# Altium footprint library Custom_Library.PcbLib: 221 footprints (part 14 of 14)
Each footprint in its own frame and in the unit in brackets; x right, y up, seen from the top. Pads: shape width x height; smd on the part's side, far side on the other; paste and mask are expansions set on the pad; w line width, h text height; cw(c..) or ccw(c..) is an arc to the next point about the centre after c.
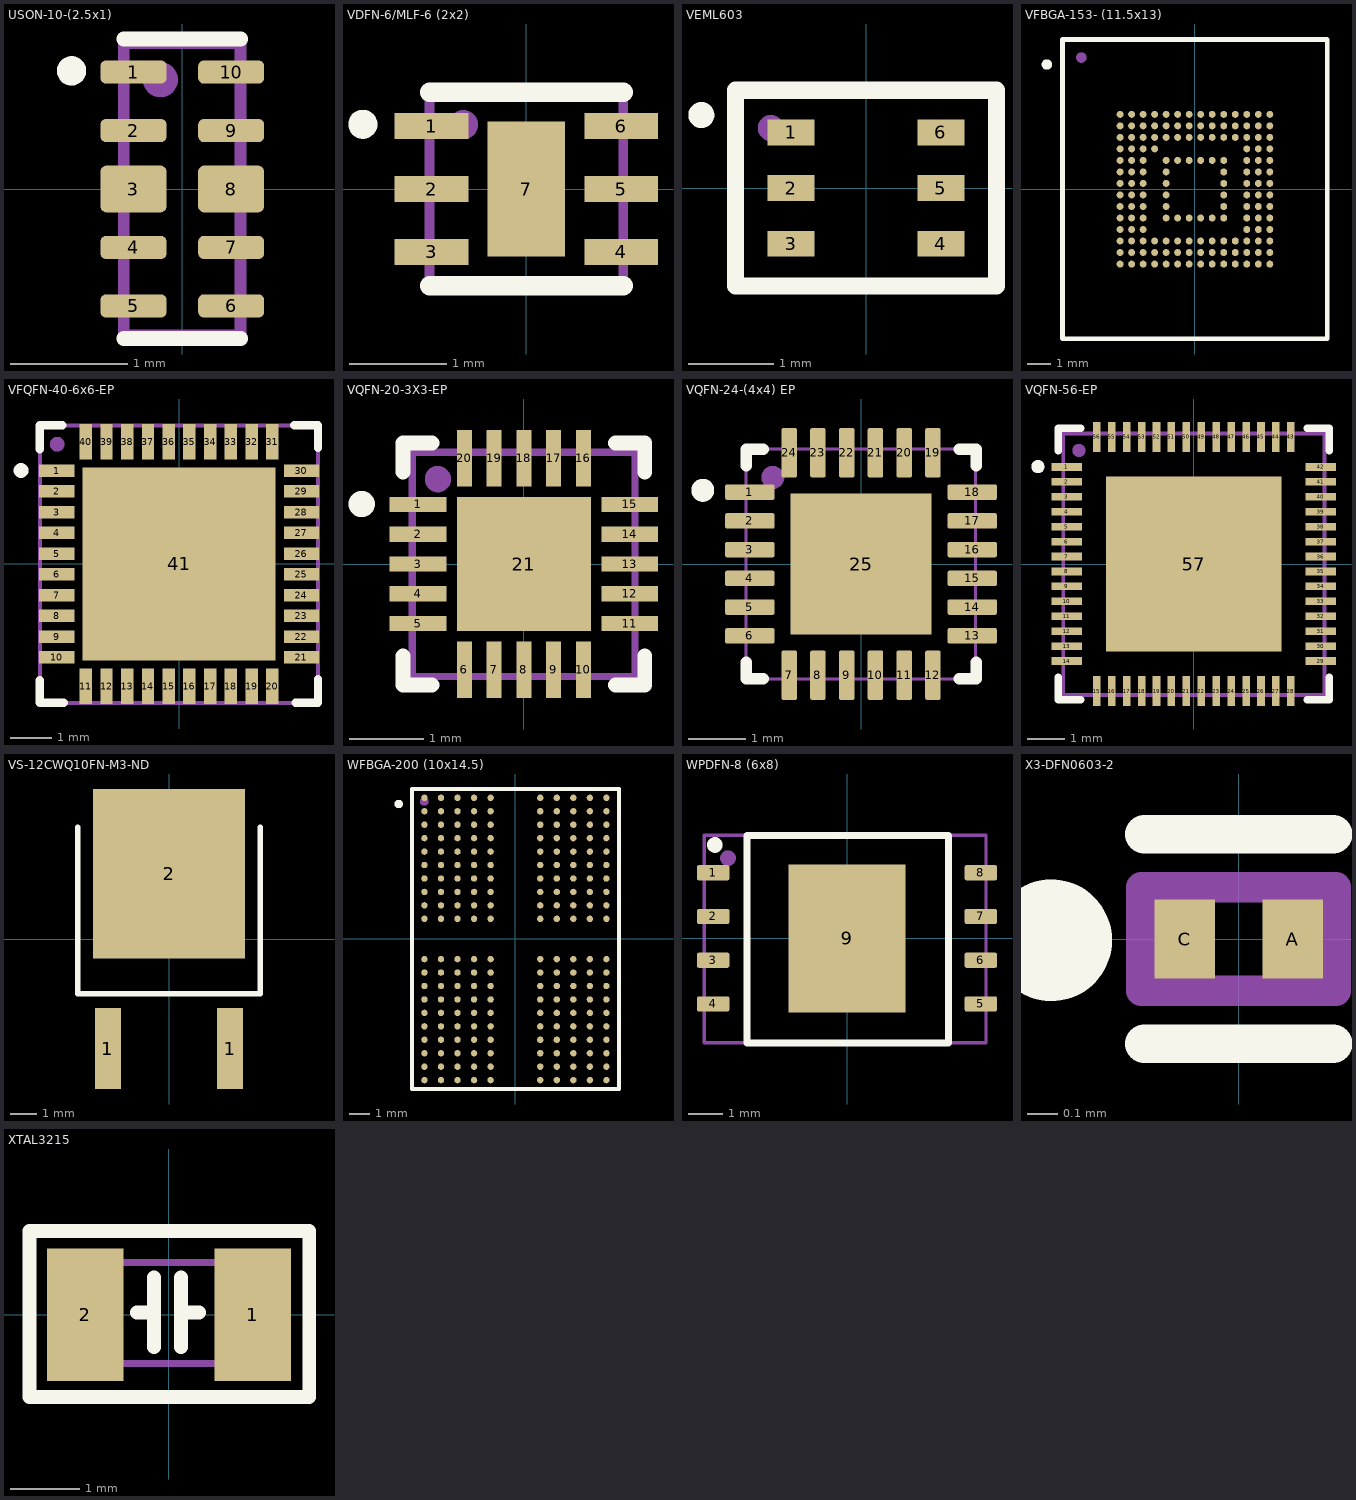
[diagram p13: the footprints below, top view; thin cyan lines are the x and y axes]

## USON-10-(2.5x1) [mm]
pads (10):
  rrect50% 0.565x0.2 smd mask+0: 1(-0.417,1) 2(-0.417,0.5) 4(-0.417,-0.5) 5(-0.417,-1) 6(0.417,-1) 7(0.417,-0.5) 9(0.417,0.5) 10(0.417,1)
  rrect25% 0.565x0.4 smd paste-1 mask+0: 3(-0.417,0) 8(0.417,0)
Top Overlay:
  circle w0.15: c-0.948,1.01 r0.05
  lines w0.127: -0.501,1.283 0.499,1.283 ; -0.501,-1.279 0.499,-1.279
Top Paste:
  drawing of 2 lines, arcs and shapes, not listed
Top Solder:
  region: -0.065,0.83 -0.77,0.83 -0.77,1.17 -0.065,1.17
  region: -0.065,0.33 -0.77,0.33 -0.77,0.67 -0.065,0.67
  region: -0.065,-0.67 -0.77,-0.67 -0.77,-0.33 -0.065,-0.33
  region: -0.065,-1.17 -0.77,-1.17 -0.77,-0.83 -0.065,-0.83
  region: 0.77,0.83 0.065,0.83 0.065,1.17 0.77,1.17
  region: 0.77,0.33 0.065,0.33 0.065,0.67 0.77,0.67
  region: 0.77,-0.67 0.065,-0.67 0.065,-0.33 0.77,-0.33
  region: 0.77,-1.17 0.065,-1.17 0.065,-0.83 0.77,-0.83
  region: -0.065,-0.27 -0.77,-0.27 -0.77,0.27 -0.065,0.27
  region: 0.77,-0.27 0.065,-0.27 0.065,0.27 0.77,0.27
Top Assembly:
  circle w0.2: c-0.188,0.935 r0.05
  lines w0.1: -0.5,-1.249 -0.5,1.247 -0.131,1.247 0.498,1.247 0.498,-1.249 -0.5,-1.249
  text "'.Designator'" at -3.275,-2.453 h1.27
3D body "TPD4EUSB30DQAR.STEP": height 0.55, standoff 0, extent -0.5,-1.25 0.5,1.25

## VDFN-6/MLF-6 (2x2) [mm]
pads (7):
  rect 0.76x0.27 smd: 1(-0.98,0.65) 2(-0.98,0) 3(-0.98,-0.65) 4(0.98,-0.65) 5(0.98,0) 6(0.98,0.65)
  rect 0.8x1.4 smd paste-2: 7(0,0)
Top Overlay:
  circle w0.2: c-1.69,0.669 r0.05
  lines w0.2: -1,-1 1,-1 ; -1,1 1,1
Top Paste:
  region: 0.255,-0.6 -0.255,-0.6 -0.255,-0.05 0.255,-0.05
  region: 0.255,0.05 -0.255,0.05 -0.255,0.6 0.255,0.6
Top Assembly:
  circle w0.2: c-0.65,0.665 r0.05
  lines w0.1: -1,-1 0.779,-1 1,-1 1,-0.4 1,1 -0.735,1 -1,1 -1,0.3 -1,-1
  text "'.Designator'" at -4.922,-2.668 h2
3D body "MIC2009YML-TR--3DModel-STEP-56544.STEP": height 0.85, standoff -0.05, extent -1,-1 1,1

## VEML603 [mm]
pads (6):
  rect 0.55x0.3 smd: 1(-0.875,0.65) 2(-0.875,0) 3(-0.875,-0.65) 4(0.875,-0.65) 5(0.875,0) 6(0.875,0.65)
Top Overlay:
  circle w0.203: c-1.926,0.853 r0.05
  lines w0.2: -1.524,-1.143 -1.524,1.143 -1.27,1.143 1.524,1.143 1.524,-1.143 -1.524,-1.143
Top Assembly:
  circle w0.203: c-1.114,0.702 r0.05
  lines w0.1: -1.522,-1.166 1.53,-1.166 1.53,1.143 -0.343,1.143 -1.522,1.143 -1.522,-1.166
  text "'.Designator'" at -4.881,-2.976 h2

## VFBGA-153- (11.5x13) [mm]
pads (153):
  round 0.3 smd mask+0: A1(-3.25,3.25) A2(-2.75,3.25) A3(-2.25,3.25) A4(-1.75,3.25) A5(-1.25,3.25) A6(-0.75,3.25) A7(-0.25,3.25) A8(0.25,3.25) A9(0.75,3.25) A10(1.25,3.25) A11(1.75,3.25) A12(2.25,3.25) A13(2.75,3.25) A14(3.25,3.25) B1(-3.25,2.75) B2(-2.75,2.75) B3(-2.25,2.75) B4(-1.75,2.75) B5(-1.25,2.75) B6(-0.75,2.75) B7(-0.25,2.75) B8(0.25,2.75) B9(0.75,2.75) B10(1.25,2.75) B11(1.75,2.75) B12(2.25,2.75) B13(2.75,2.75) B14(3.25,2.75) C1(-3.25,2.25) C2(-2.75,2.25) C3(-2.25,2.25) C4(-1.75,2.25) C5(-1.25,2.25) C6(-0.75,2.25) C7(-0.25,2.25) C8(0.25,2.25) C9(0.75,2.25) C10(1.25,2.25) C11(1.75,2.25) C12(2.25,2.25) C13(2.75,2.25) C14(3.25,2.25) D1(-3.25,1.75) D2(-2.75,1.75) D3(-2.25,1.75) D4(-1.75,1.75) D12(2.25,1.75) D13(2.75,1.75) D14(3.25,1.75) E1(-3.25,1.25) E2(-2.75,1.25) E3(-2.25,1.25) E5(-1.25,1.25) E6(-0.75,1.25) E7(-0.25,1.25) E8(0.25,1.25) E9(0.75,1.25) E10(1.25,1.25) E12(2.25,1.25) E13(2.75,1.25) E14(3.25,1.25) F1(-3.25,0.75) F2(-2.75,0.75) F3(-2.25,0.75) F5(-1.25,0.75) F10(1.25,0.75) F12(2.25,0.75) F13(2.75,0.75) F14(3.25,0.75) G1(-3.25,0.25) G2(-2.75,0.25) G3(-2.25,0.25) G5(-1.25,0.25) G10(1.25,0.25) G12(2.25,0.25) G13(2.75,0.25) G14(3.25,0.25) H1(-3.25,-0.25) H2(-2.75,-0.25) H3(-2.25,-0.25) H5(-1.25,-0.25) H10(1.25,-0.25) H12(2.25,-0.25) H13(2.75,-0.25) H14(3.25,-0.25) J1(-3.25,-0.75) J2(-2.75,-0.75) J3(-2.25,-0.75) J5(-1.25,-0.75) J10(1.25,-0.75) J12(2.25,-0.75) J13(2.75,-0.75) J14(3.25,-0.75) K1(-3.25,-1.25) K2(-2.75,-1.25) K3(-2.25,-1.25) K5(-1.25,-1.25) K6(-0.75,-1.25) K7(-0.25,-1.25) K8(0.25,-1.25) K9(0.75,-1.25) K10(1.25,-1.25) K12(2.25,-1.25) K13(2.75,-1.25) K14(3.25,-1.25) L1(-3.25,-1.75) L2(-2.75,-1.75) L3(-2.25,-1.75) L12(2.25,-1.75) L13(2.75,-1.75) L14(3.25,-1.75) M1(-3.25,-2.25) M2(-2.75,-2.25) M3(-2.25,-2.25) M4(-1.75,-2.25) M5(-1.25,-2.25) M6(-0.75,-2.25) M7(-0.25,-2.25) M8(0.25,-2.25) M9(0.75,-2.25) M10(1.25,-2.25) M11(1.75,-2.25) M12(2.25,-2.25) M13(2.75,-2.25) M14(3.25,-2.25) N1(-3.25,-2.75) N2(-2.75,-2.75) N3(-2.25,-2.75) N4(-1.75,-2.75) N5(-1.25,-2.75) N6(-0.75,-2.75) N7(-0.25,-2.75) N8(0.25,-2.75) N9(0.75,-2.75) N10(1.25,-2.75) N11(1.75,-2.75) N12(2.25,-2.75) N13(2.75,-2.75) N14(3.25,-2.75) P1(-3.25,-3.25) P2(-2.75,-3.25) P3(-2.25,-3.25) P4(-1.75,-3.25) P5(-1.25,-3.25) P6(-0.75,-3.25) P7(-0.25,-3.25) P8(0.25,-3.25) P9(0.75,-3.25) P10(1.25,-3.25) P11(1.75,-3.25) P12(2.25,-3.25) P13(2.75,-3.25) P14(3.25,-3.25)
Top Overlay:
  circle w0.254: c-6.429,5.413 r0.1
  lines w0.2: -5.75,-6.5 5.75,-6.5 5.75,6.5 -4.5,6.5 -5.7,6.5 -5.75,6.5 -5.75,-6.5
Top Solder:
  drawing of 153 lines, arcs and shapes, not listed
Top Assembly:
  circle w0.254: c-4.933,5.715 r0.1
  lines w0.1: -5.75,-6.504 -5.75,6.521 -5.726,6.521 5.753,6.521 5.753,-6.504 -5.75,-6.504
  text "'.Designator'" at -5.172,-8.855 h2

## VFQFN-40-6x6-EP [mm]
pads (41):
  rect 0.85x0.3 smd: 1(-2.95,2.25) 2(-2.95,1.75) 3(-2.95,1.25) 4(-2.95,0.75) 5(-2.95,0.25) 6(-2.95,-0.25) 7(-2.95,-0.75) 8(-2.95,-1.25) 9(-2.95,-1.75) 10(-2.95,-2.25) 21(2.95,-2.25) 22(2.95,-1.75) 23(2.95,-1.25) 24(2.95,-0.75) 25(2.95,-0.25) 26(2.95,0.25) 27(2.95,0.75) 28(2.95,1.25) 29(2.95,1.75) 30(2.95,2.25)
  rect 0.3x0.85 smd: 11(-2.25,-2.95) 12(-1.75,-2.95) 13(-1.25,-2.95) 14(-0.75,-2.95) 15(-0.25,-2.95) 16(0.25,-2.95) 17(0.75,-2.95) 18(1.25,-2.95) 19(1.75,-2.95) 20(2.25,-2.95) 31(2.25,2.95) 32(1.75,2.95) 33(1.25,2.95) 34(0.75,2.95) 35(0.25,2.95) 36(-0.25,2.95) 37(-0.75,2.95) 38(-1.25,2.95) 39(-1.75,2.95) 40(-2.25,2.95)
  rect 4.65x4.65 smd: 41(0,0)
Top Overlay:
  circle w0.254: c-3.811,2.256 r0.049
  lines w0.2: -3.358,-2.804 -3.358,-3.349 -2.781,-3.349 ; -3.358,2.767 -3.358,3.345 -2.813,3.345 ; 2.775,3.345 3.352,3.345 3.352,2.799 ; 2.807,-3.349 3.352,-3.349 3.352,-2.771
Top Assembly:
  circle w0.254: c-2.94,2.889 r0.049
  lines w0.1: -3.358,-3.349 3.352,-3.349 3.352,3.345 -3.245,3.345 -3.358,3.345 -3.358,-3.349
3D body "SI5332B-D-GM2R.stp": height 1.2, standoff 0, extent -3.345,-3.345 3.345,3.345

## VQFN-20-3X3-EP [mil]
pads (21):
  rect 30x8 smd: 1(-56,31.5) 2(-56,15.75) 3(-56,0) 4(-56,-15.75) 5(-56,-31.5) 11(56,-31.5) 12(56,-15.75) 13(56,0) 14(56,15.75) 15(56,31.5)
  rect 8x30 smd: 6(-31.5,-56) 7(-15.75,-56) 8(0,-56) 9(15.75,-56) 10(31.5,-56) 16(31.5,56) 17(15.75,56) 18(0,56) 19(-15.75,56) 20(-31.5,56)
  rect 71x71 smd: 21(0,0)
Top Overlay:
  circle w10: c-85.82,31.74 r1.95
  lines w7.87: -64,-48.6 -64,-64 -48.6,-64 ; -64,48.6 -64,64 -48.6,64 ; 48.6,-64 64,-64 64,-48.6 ; 48.6,64 64,64 64,48.6
Top Assembly:
  circle w10: c-45.5,44.91 r1.95
  lines w3.94: -59.07,-59.53 -59.07,59.07 58.83,59.07 58.83,19.23 58.83,-59.53 39.14,-59.53 -59.07,-59.53
  text "'.Designator'" at -203.61,-132.1 h78.74
3D body "VQFN20_3X3_MCH.step": height 23.11, standoff 0, extent -59.02,-59.02 59.01,59.01
3D body: height 10, standoff 0, extent 0,0 10,10

## VQFN-24-(4x4) EP [mm]
pads (25):
  rrect25% 0.86x0.27 smd: 1(-1.935,1.25) 2(-1.935,0.75) 3(-1.935,0.25) 4(-1.935,-0.25) 5(-1.935,-0.75) 6(-1.935,-1.25) 13(1.935,-1.25) 14(1.935,-0.75) 15(1.935,-0.25) 16(1.935,0.25) 17(1.935,0.75) 18(1.935,1.25)
  rrect25% 0.27x0.86 smd: 7(-1.25,-1.935) 8(-0.75,-1.935) 9(-0.25,-1.935) 10(0.25,-1.935) 11(0.75,-1.935) 12(1.25,-1.935) 19(1.25,1.935) 20(0.75,1.935) 21(0.25,1.935) 22(-0.25,1.935) 23(-0.75,1.935) 24(-1.25,1.935)
  rect 2.45x2.45 smd paste-2: 25(0,0)
Top Overlay:
  circle w0.2: c-2.754,1.283 r0.1
  lines w0.2: -2,-1.705 -2,-2 -1.705,-2 ; -2,1.705 -2,2 -1.705,2 ; 1.705,-2 2,-2 2,-1.705 ; 1.705,2 2,2 2,1.705
Top Paste:
  region: 0.775,-0.775 -0.775,-0.775 -0.775,0.775 0.775,0.775
Top Assembly:
  circle w0.2: c-1.535,1.506 r0.1
  lines w0.05: -2,-2 -2,2 1.993,2 1.993,-2 -2,-2
  text "'.Designator'" at -5.145,-4.042 h2
3D body "step_temp.STEP": height 1, standoff 0, extent -2,-2 2,2

## VQFN-56-EP [mil]
pads (57):
  rect 32x8 smd: 1(-134,102.36) 2(-134,86.61) 3(-134,70.87) 4(-134,55.12) 5(-134,39.37) 6(-134,23.62) 7(-134,7.87) 8(-134,-7.87) 9(-134,-23.62) 10(-134,-39.37) 11(-134,-55.12) 12(-134,-70.87) 13(-134,-86.61) 14(-134,-102.36) 29(134,-102.36) 30(134,-86.61) 31(134,-70.87) 32(134,-55.12) 33(134,-39.37) 34(134,-23.62) 35(134,-7.87) 36(134,7.87) 37(134,23.62) 38(134,39.37) 39(134,55.12) 40(134,70.87) 41(134,86.61) 42(134,102.36)
  rect 8x32 smd: 15(-102.36,-134) 16(-86.61,-134) 17(-70.87,-134) 18(-55.12,-134) 19(-39.37,-134) 20(-23.62,-134) 21(-7.87,-134) 22(7.87,-134) 23(23.62,-134) 24(39.37,-134) 25(55.12,-134) 26(70.87,-134) 27(86.61,-134) 28(102.36,-134) 43(102.36,134) 44(86.61,134) 45(70.87,134) 46(55.12,134) 47(39.37,134) 48(23.62,134) 49(7.87,134) 50(-7.87,134) 51(-23.62,134) 52(-39.37,134) 53(-55.12,134) 54(-70.87,134) 55(-86.61,134) 56(-102.36,134)
  rect 185x185 smd mask+6: 57(0,0)
Top Overlay:
  circle w10: c-164.56,102.69 r1.95
  lines w7.87: -143,-119.46 -143,-143 -119.46,-143 ; -143,119.46 -143,143 -119.46,143 ; 119.46,-143 143,-143 143,-119.46 ; 119.46,143 143,143 143,119.46
Top Paste:
  region: -34.77,88.56 -88.56,88.56 -88.56,34.77 -34.77,34.77
  region: -34.77,26.9 -88.56,26.9 -88.56,-26.9 -34.77,-26.9
  region: -34.77,-34.77 -88.56,-34.77 -88.56,-88.56 -34.77,-88.56
  region: 26.9,88.56 -26.9,88.56 -26.9,34.77 26.9,34.77
  region: 26.9,26.9 -26.9,26.9 -26.9,-26.9 26.9,-26.9
  region: 26.9,-34.77 -26.9,-34.77 -26.9,-88.56 26.9,-88.56
  region: 88.56,88.56 34.77,88.56 34.77,34.77 88.56,34.77
  region: 88.56,26.9 34.77,26.9 34.77,-26.9 88.56,-26.9
  region: 88.56,-34.77 34.77,-34.77 34.77,-88.56 88.56,-88.56
Top Assembly:
  circle w10: c-121.21,119.79 r1.95
  lines w3.94: -137.89,-138.14 111.21,-138.14 137.8,-138.14 137.8,78.74 137.8,137.72 -115.59,137.72 -137.89,137.72 -137.89,115.42 -137.89,-138.14
  text "'.Designator'" at -210.25,-220.68 h78.74
3D body: height 10, standoff 0, extent 0,0 10,10
3D body "VQFN56_2G_MCH.step": height 39.09, standoff 0, extent -137.99,-137.99 137.99,137.99

## VS-12CWQ10FN-M3-ND [mm]
pads (3):
  rect 0.97x3.02 smd mask+0.152: 1(-2.286,-4.09) 1(2.286,-4.09)
  rect 5.67x6.32 smd paste-4 mask+0.152: 2(0,2.44)
Top Overlay:
  lines w0.2: -3.4,4.176 -3.4,-2.044 3.4,-2.044 3.4,4.176
Top Paste:
  region: 2.27,-0.35 0.55,-0.35 0.55,1.01 2.27,1.01
  region: 2.27,1.76 0.55,1.76 0.55,3.12 2.27,3.12
  region: 2.27,3.87 0.55,3.87 0.55,5.23 2.27,5.23
  region: -0.55,-0.35 -2.27,-0.35 -2.27,1.01 -0.55,1.01
  region: -0.55,1.76 -2.27,1.76 -2.27,3.12 -0.55,3.12
  region: -0.55,3.87 -2.27,3.87 -2.27,5.23 -0.55,5.23
3D body "VS-12CWQ10FN-M3.stp": height 2.49, standoff 0.05, extent -3.366,-5.202 3.366,6.482

## WFBGA-200 (10x14.5) [mm]
pads (200):
  round 0.309 smd: A1(-4.4,6.825) A2(-3.6,6.825) A3(-2.8,6.825) A4(-2,6.825) A5(-1.2,6.825) A8(1.2,6.825) A9(2,6.825) A10(2.8,6.825) A11(3.6,6.825) A12(4.4,6.825) AA1(-4.4,-6.175) AA2(-3.6,-6.175) AA3(-2.8,-6.175) AA4(-2,-6.175) AA5(-1.2,-6.175) AA8(1.2,-6.175) AA9(2,-6.175) AA10(2.8,-6.175) AA11(3.6,-6.175) AA12(4.4,-6.175) AB1(-4.4,-6.825) AB2(-3.6,-6.825) AB3(-2.8,-6.825) AB4(-2,-6.825) AB5(-1.2,-6.825) AB8(1.2,-6.825) AB9(2,-6.825) AB10(2.8,-6.825) AB11(3.6,-6.825) AB12(4.4,-6.825) B1(-4.4,6.175) B2(-3.6,6.175) B3(-2.8,6.175) B4(-2,6.175) B5(-1.2,6.175) B8(1.2,6.175) B9(2,6.175) B10(2.8,6.175) B11(3.6,6.175) B12(4.4,6.175) C1(-4.4,5.525) C2(-3.6,5.525) C3(-2.8,5.525) C4(-2,5.525) C5(-1.2,5.525) C8(1.2,5.525) C9(2,5.525) C10(2.8,5.525) C11(3.6,5.525) C12(4.4,5.525) D1(-4.4,4.875) D2(-3.6,4.875) D3(-2.8,4.875) D4(-2,4.875) D5(-1.2,4.875) D8(1.2,4.875) D9(2,4.875) D10(2.8,4.875) D11(3.6,4.875) D12(4.4,4.875) E1(-4.4,4.225) E2(-3.6,4.225) E3(-2.8,4.225) E4(-2,4.225) E5(-1.2,4.225) E8(1.2,4.225) E9(2,4.225) E10(2.8,4.225) E11(3.6,4.225) E12(4.4,4.225) F1(-4.4,3.575) F2(-3.6,3.575) F3(-2.8,3.575) F4(-2,3.575) F5(-1.2,3.575) F8(1.2,3.575) F9(2,3.575) F10(2.8,3.575) F11(3.6,3.575) F12(4.4,3.575) G1(-4.4,2.925) G2(-3.6,2.925) G3(-2.8,2.925) G4(-2,2.925) G5(-1.2,2.925) G8(1.2,2.925) G9(2,2.925) G10(2.8,2.925) G11(3.6,2.925) G12(4.4,2.925) H1(-4.4,2.275) H2(-3.6,2.275) H3(-2.8,2.275) H4(-2,2.275) H5(-1.2,2.275) H8(1.2,2.275) H9(2,2.275) H10(2.8,2.275) H11(3.6,2.275) H12(4.4,2.275) J1(-4.4,1.625) J2(-3.6,1.625) J3(-2.8,1.625) J4(-2,1.625) J5(-1.2,1.625) J8(1.2,1.625) J9(2,1.625) J10(2.8,1.625) J11(3.6,1.625) J12(4.4,1.625) K1(-4.4,0.975) K2(-3.6,0.975) K3(-2.8,0.975) K4(-2,0.975) K5(-1.2,0.975) K8(1.2,0.975) K9(2,0.975) K10(2.8,0.975) K11(3.6,0.975) K12(4.4,0.975) N1(-4.4,-0.975) N2(-3.6,-0.975) N3(-2.8,-0.975) N4(-2,-0.975) N5(-1.2,-0.975) N8(1.2,-0.975) N9(2,-0.975) N10(2.8,-0.975) N11(3.6,-0.975) N12(4.4,-0.975) P1(-4.4,-1.625) P2(-3.6,-1.625) P3(-2.8,-1.625) P4(-2,-1.625) P5(-1.2,-1.625) P8(1.2,-1.625) P9(2,-1.625) P10(2.8,-1.625) P11(3.6,-1.625) P12(4.4,-1.625) R1(-4.4,-2.275) R2(-3.6,-2.275) R3(-2.8,-2.275) R4(-2,-2.275) R5(-1.2,-2.275) R8(1.2,-2.275) R9(2,-2.275) R10(2.8,-2.275) R11(3.6,-2.275) R12(4.4,-2.275) T1(-4.4,-2.925) T2(-3.6,-2.925) T3(-2.8,-2.925) T4(-2,-2.925) T5(-1.2,-2.925) T8(1.2,-2.925) T9(2,-2.925) T10(2.8,-2.925) T11(3.6,-2.925) T12(4.4,-2.925) U1(-4.4,-3.575) U2(-3.6,-3.575) U3(-2.8,-3.575) U4(-2,-3.575) U5(-1.2,-3.575) U8(1.2,-3.575) U9(2,-3.575) U10(2.8,-3.575) U11(3.6,-3.575) U12(4.4,-3.575) V1(-4.4,-4.225) V2(-3.6,-4.225) V3(-2.8,-4.225) V4(-2,-4.225) V5(-1.2,-4.225) V8(1.2,-4.225) V9(2,-4.225) V10(2.8,-4.225) V11(3.6,-4.225) V12(4.4,-4.225) W1(-4.4,-4.875) W2(-3.6,-4.875) W3(-2.8,-4.875) W4(-2,-4.875) W5(-1.2,-4.875) W8(1.2,-4.875) W9(2,-4.875) W10(2.8,-4.875) W11(3.6,-4.875) W12(4.4,-4.875) Y1(-4.4,-5.525) Y2(-3.6,-5.525) Y3(-2.8,-5.525) Y4(-2,-5.525) Y5(-1.2,-5.525) Y8(1.2,-5.525) Y9(2,-5.525) Y10(2.8,-5.525) Y11(3.6,-5.525) Y12(4.4,-5.525)
Top Overlay:
  circle w0.254: c-5.642,6.526 r0.076
  lines w0.2: -5,-7.25 -5,7.25 5,7.25 5,-7.25 -5,-7.25
Top Assembly:
  circle w0.254: c-4.408,6.648 r0.076
  lines w0.1: -5.003,-7.255 4.997,-7.255 4.997,7.252 -0.044,7.252 -5.003,7.252 -5.003,-7.255
  text "'.Designator'" at -5.238,-9.898 h2

## WPDFN-8 (6x8) [mm]
pads (9):
  rrect25% 0.94x0.44 smd: 1(-3.885,1.905) 2(-3.885,0.635) 3(-3.885,-0.635) 4(-3.885,-1.905) 5(3.885,-1.905) 6(3.885,-0.635) 7(3.885,0.635) 8(3.885,1.905)
  rect 3.4x4.3 smd paste-3: 9(0,0)
Top Overlay:
  circle w0.254: c-3.839,2.711 r0.1
  lines w0.2: -2.908,-3.037 -2.908,2.985 -2.491,2.985 2.947,2.985 2.947,-3.037 -2.908,-3.037
Top Paste:
  region: 1.08,-1.36 -1.08,-1.36 -1.08,1.36 1.08,1.36
Top Assembly:
  circle w0.254: c-3.455,2.328 r0.1
  lines w0.1: -4.146,-3.028 4.035,-3.028 4.035,2.998 -4.065,2.998 -4.146,2.998 -4.146,-3.028
  text "'.Designator'" at -5.587,-5.259 h2

## X3-DFN0603-2 [mm]
pads (2):
  rect 0.2x0.26 smd: A(0.178,0) C(-0.178,0)
Top Overlay:
  circle w0.3: c-0.617,-0.004 r0.05
  lines w0.127: -0.31,-0.345 0.31,-0.345 ; -0.31,0.345 0.31,0.345
Top Assembly:
  lines w0.1: -0.32,-0.17 0.32,-0.17 0.32,0.17 -0.32,0.17 -0.32,-0.17
  text "'.Designator'" at -2.884,-1.447 h1.27
3D body: height 0.3, standoff 0, extent -0.32,-0.17 0.32,0.17

## XTAL3215 [mm] "XTAL3215"
pads (2):
  rect 1.1x1.9 smd: 1(1.2,0) 2(-1.2,0)
Top Overlay:
  lines w0.2: -0.462,0.031 -0.212,0.034 ; -0.212,-0.466 -0.212,0.534 ; 0.172,-0.465 0.172,0.535 ; 0.172,0.035 0.427,0.031 ; -2,-1.18 -0.25,-1.18 2.01,-1.18 2.01,0.61 2.01,1.2 -1.84,1.2 -2,1.2 -2,1.03 -2,-1.18
Top Assembly:
  lines w0.1: -1.6,-0.7 1.7,-0.7 1.7,0.75 -0.313,0.75 -1.6,0.75 -1.6,-0.7
  text "'.Designator'" at -3.804,-2.319 h1.27
3D body "User Library-NDK_NX3215SA.STEP": height 0.8, standoff 0, extent -1.61,-0.74 1.59,0.76